# Altium footprint library 未分类器件.PcbLib: 52 footprints (part 4 of 4)
Each footprint in its own frame and in the unit in brackets; x right, y up, seen from the top. Pads: shape width x height; smd on the part's side, far side on the other; paste and mask are expansions set on the pad; w line width, h text height; cw(c..) or ccw(c..) is an arc to the next point about the centre after c.
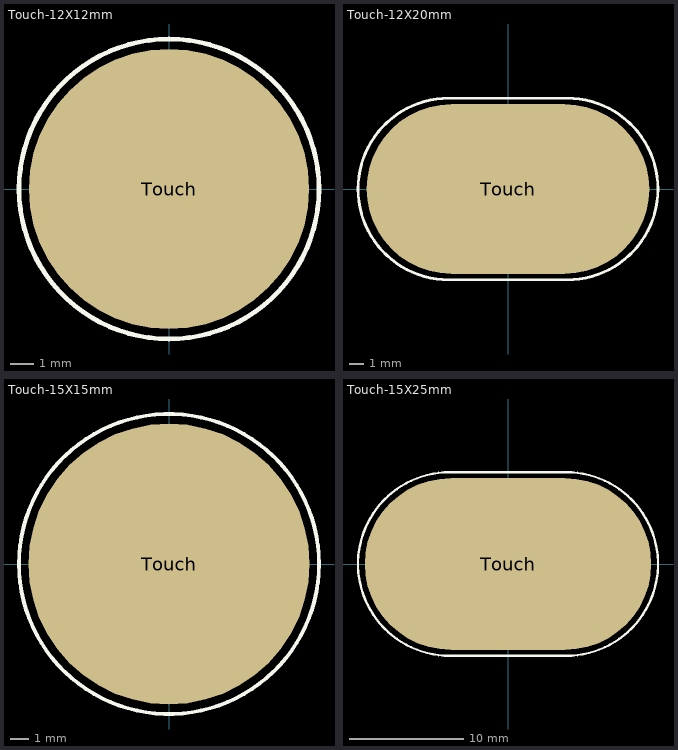
[diagram p3: the footprints below, top view; thin cyan lines are the x and y axes]

## Touch-12X12mm [mm] "触摸焊盘12mm*12mm"
pads (1):
  round 12 smd paste-12 mask+0.5: Touch(0,0)
Top Overlay:
  circle w0.203: c0,0 r6.422
Keep-Out Layer:
  circle w0.1: c0,0 r1.5

## Touch-12X20mm [mm] "触摸焊盘12mm*20mm"
pads (1):
  oval 20x12 smd paste-12 mask+0.5: Touch(0,0)
Top Overlay:
  lines w0.203: -4.191,-6.422 cw(c-4.191,0) -4.191,6.422 4.191,6.422 cw(c4.191,0) 4.191,-6.422 -4.191,-6.422
Keep-Out Layer:
  circle w0.1: c0,0 r1.5

## Touch-15X15mm [mm] "触摸焊盘15mm*15mm"
pads (1):
  round 15 smd paste-15 mask+0.5: Touch(0,0)
Top Overlay:
  circle w0.203: c0,0 r8.009
Keep-Out Layer:
  circle w0.1: c0,0 r1.5

## Touch-15X25mm [mm] "触摸焊盘15mm*25mm"
pads (1):
  oval 25x15 smd paste-15 mask+0.5: Touch(0,0)
Top Overlay:
  lines w0.203: -5.08,-8.009 cw(c-5.08,0) -5.08,8.009 5.08,8.009 cw(c5.08,0) 5.08,-8.009 -5.08,-8.009
Keep-Out Layer:
  circle w0.1: c0,0 r1.5